# Altium footprint library 全库.PcbLib: 967 footprints (part 42 of 61)
Each footprint in its own frame and in the unit in brackets; x right, y up, seen from the top. Pads: shape width x height; smd on the part's side, far side on the other; paste and mask are expansions set on the pad; w line width, h text height; cw(c..) or ccw(c..) is an arc to the next point about the centre after c.
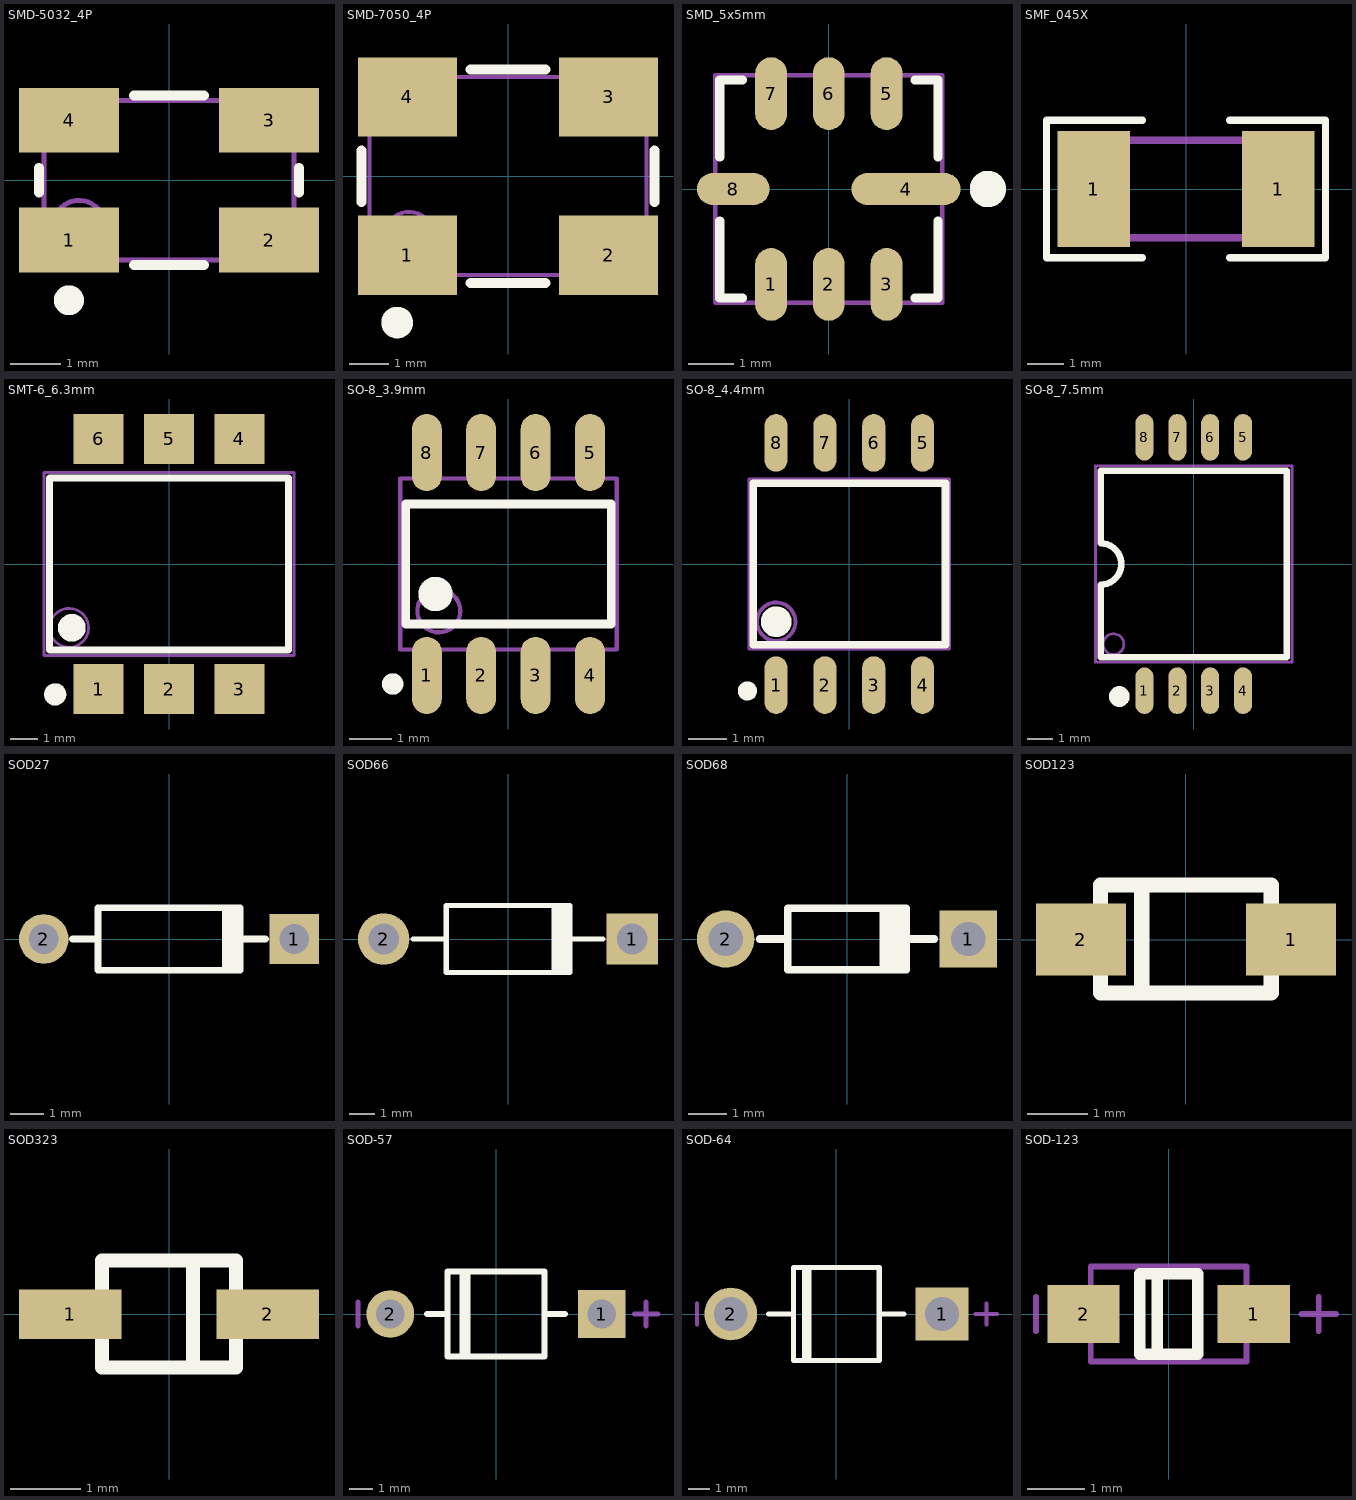
[diagram p41: the footprints below, top view; thin cyan lines are the x and y axes]

## SMD-5032_4P [mm]
pads (4):
  rect 2x1.3 smd: 1(-2,-1.2) 2(2,-1.2) 3(2,1.2) 4(-2,1.2)
Top Overlay:
  circle w0.3: c-2,-2.4 r0.15
  lines w0.2: -2.6,-0.25 -2.6,0.25 ; -0.7,-1.7 0.7,-1.7 ; -0.7,1.7 0.7,1.7 ; 2.6,-0.25 2.6,0.25
Mechanical 13:
  circle w0.1: c-1.8,-0.9 r0.5
  lines w0.1: -2.5,-1.6 -2.5,1.6 2.5,1.6 2.5,-1.6 -2.5,-1.6

## SMD-7050_4P [mm]
pads (4):
  rect 2.5x2 smd: 1(-2.54,-2) 2(2.54,-2) 3(2.54,2) 4(-2.54,2)
Top Overlay:
  circle w0.4: c-2.8,-3.7 r0.2
  lines w0.254: -3.7,-0.65 -3.7,0.65 ; -0.95,-2.7 0.95,-2.7 ; -0.95,2.7 0.95,2.7 ; 3.7,-0.65 3.7,0.65
Mechanical 13:
  circle w0.1: c-2.5,-1.5 r0.6
  lines w0.1: -3.5,-2.5 3.5,-2.5 3.5,2.5 -3.5,2.5 -3.5,-2.5

## SMD_5x5mm [mm]
pads (8):
  oval 0.7x1.6 smd mask+0.051: 1(-1.27,-2.1) 2(0,-2.1) 3(1.27,-2.1) 5(1.27,2.1) 6(0,2.1) 7(-1.27,2.1)
  oval 2.4x0.7 smd mask+0.051: 4(1.7,0)
  oval 1.6x0.7 smd mask+0.051: 8(-2.1,0)
Top Overlay:
  circle w0.4: c3.5,0 r0.2
  lines w0.2: -2.4,-0.7 -2.4,-2.4 -1.9,-2.4 ; -2.4,0.7 -2.4,2.4 -1.9,2.4 ; 1.9,-2.4 2.4,-2.4 2.4,-0.7 ; 1.9,2.4 2.4,2.4 2.4,0.7
Mechanical 13:
  lines w0.1: -2.5,-2.5 2.5,-2.5 2.5,2.5 -2.5,2.5 -2.5,-2.5

## SMF_045X [mm]
pads (2):
  rect 2x3.2 smd: 1(-2.55,0) 1(2.55,0)
Top Overlay:
  lines w0.2: -1.2,-1.9 -3.861,-1.9 -3.861,1.9 -1.2,1.9 ; 1.2,-1.9 3.861,-1.9 3.861,1.9 1.2,1.9
Mechanical 13:
  lines w0.2: -3.05,-1.35 -3.05,1.35 3.05,1.35 3.05,-1.35 -3.05,-1.35

## SMT-6_6.3mm [mm]
pads (6):
  rect 1.8x1.8 smd: 1(-2.54,-4.505) 2(0,-4.505) 3(2.54,-4.505) 4(2.54,4.505) 5(0,4.505) 6(-2.54,4.505)
Top Overlay:
  circle w0.4: c-4.1,-4.7 r0.2
  circle w0.5: c-3.5,-2.3 r0.25
  lines w0.254: -4.3,-3.1 4.3,-3.1 4.3,3.1 -4.3,3.1 -4.3,-3.1
Mechanical 13:
  circle w0.1: c-3.6,-2.3 r0.7
  lines w0.1: -4.5,-3.3 4.5,-3.3 4.5,3.3 -4.5,3.3 -4.5,-3.3

## SO-8_3.9mm [mm]
pads (8):
  oval 0.7x1.8 smd: 1(-1.905,-2.6) 2(-0.635,-2.6) 3(0.635,-2.6) 4(1.905,-2.6) 5(1.905,2.6) 6(0.635,2.6) 7(-0.635,2.6) 8(-1.905,2.6)
Top Overlay:
  circle w0.4: c-1.7,-0.7 r0.2
  circle w0.25: c-2.7,-2.8 r0.125
  lines w0.2: -2.4,-1.4 2.4,-1.4 2.4,1.4 -2.4,1.4 -2.4,-1.4
Mechanical 13:
  circle w0.1: c-1.625,-1.095 r0.5
  lines w0.1: -2.525,-1.995 2.525,-1.995 2.525,1.995 -2.525,1.995 -2.525,-1.995

## SO-8_4.4mm [mm]
pads (8):
  oval 0.6x1.5 smd: 1(-1.905,-3.15) 2(-0.635,-3.15) 3(0.635,-3.15) 4(1.905,-3.15) 5(1.905,3.15) 6(0.635,3.15) 7(-0.635,3.15) 8(-1.905,3.15)
Top Overlay:
  circle w0.4: c-1.9,-1.5 r0.2
  circle w0.25: c-2.65,-3.3 r0.125
  lines w0.2: -2.5,-2.1 2.5,-2.1 2.5,2.1 -2.5,2.1 -2.5,-2.1
Mechanical 13:
  circle w0.1: c-1.9,-1.5 r0.5
  lines w0.1: -2.6,-2.2 2.6,-2.2 2.6,2.2 -2.6,2.2 -2.6,-2.2

## SO-8_7.5mm [mm]
pads (8):
  oval 0.7x1.8 smd: 1(-1.905,-4.9) 2(-0.635,-4.9) 3(0.635,-4.9) 4(1.905,-4.9) 5(1.905,4.9) 6(0.635,4.9) 7(-0.635,4.9) 8(-1.905,4.9)
Top Overlay:
  circle w0.4: c-2.875,-5.125 r0.2
  lines w0.254: -3.6,-3.6 3.6,-3.6 3.6,3.6 -3.6,3.6 -3.6,0.8 cw(c-3.6,0) -3.6,-0.8 -3.6,-3.6
Mechanical 13:
  circle w0.1: c-3.1,-3.1 r0.4
  lines w0.1: -3.8,-3.8 3.8,-3.8 3.8,3.8 -3.8,3.8 -3.8,-3.8

## SOD27 [mm] "Diode, Axial; Body 4.3 x 1.9 mm (LxDia. max), Lead Dia. 0.56 mm (max)"
height 1.9
pads (2):
  rect 1.5x1.5 hole 0.9: 1(3.79,0)
  round 1.5 hole 0.9: 2(-3.79,0)
Top Overlay:
  rectangle: 1.6,-0.95 2.25,0.95
  lines w0.2: -2.921,0 -2.15,0 ; 2.15,-0.95 -2.15,-0.95 -2.15,0.95 2.15,0.95 ; 2.159,0 2.921,0

## SOD66 [mm] "Diode, Axial; Body 4.8 x 2.6 mm (LxDia. max), Lead Dia. 0.81 mm (max)"
height 2.6
pads (2):
  rect 2x2 hole 1.2: 1(4.83,0)
  round 2 hole 1.2: 2(-4.83,0)
Top Overlay:
  rectangle: 1.7,-1.3 2.5,1.3
  lines w0.2: -3.683,0 -2.4,0 ; 2.4,-1.3 -2.4,-1.3 -2.4,1.3 2.4,1.3 ; 2.413,0 3.683,0

## SOD68 [mm] "Diode, Axial; Body 3 x 1.6 mm (LxDia. max), Lead Dia. 0.55 mm (max)"
height 1.6
pads (2):
  rect 1.5x1.5 hole 0.9: 1(3.175,0)
  round 1.5 hole 0.9: 2(-3.175,0)
Top Overlay:
  rectangle: 0.85,-0.8 1.65,0.8
  lines w0.2: -2.286,0 -1.55,0 ; 1.55,-0.8 -1.55,-0.8 -1.55,0.8 1.55,0.8 ; 1.651,0 2.286,0

## SOD123 [mm]
pads (2):
  rect 1.5x1.2 smd: 1(1.753,0) 2(-1.752,0)
Top Overlay:
  lines w0.254: -0.736,-0.889 -0.736,0.911 ; -1.427,-0.889 1.423,-0.889 1.423,0.911 -1.427,0.911 -1.427,-0.889

## SOD323 [mm] "SOD-323/SC-76; 2 Leads; Body 1.7 x 1.3 mm, (LxW)"
height 1.1
pads (2):
  rect 1.45x0.7 smd: 1(-1.397,0) 2(1.397,0)
Top Overlay:
  lines w0.2: 0.339,-0.75 0.339,0.762 ; -0.95,-0.75 -0.95,0.762 0.95,0.762 0.95,-0.75 -0.95,-0.75

## SOD-57 [mm]
pads (2):
  rect 2x2 hole 1.2: 1(4.445,0)
  round 2 hole 1.2: 2(-4.445,0)
Top Overlay:
  lines w0.254: -2.9,0 -2.032,0 ; -1.4,-1.778 -1.4,1.778 ; -1.2,-1.778 -1.2,1.778 ; 2.032,0 2.9,0 ; -2.032,-1.778 -2.032,1.778 2.032,1.778 2.032,-1.778 -2.032,-1.778
Mechanical 15:
  lines w0.203: -5.8,-0.5 -5.8,0.5 ; 5.8,0 6.8,0 ; 6.3,-0.5 6.3,0.5

## SOD-64 [mm]
pads (2):
  rect 2.5x2.5 hole 1.6: 1(5,0)
  round 2.5 hole 1.6: 2(-5,0)
Top Overlay:
  lines w0.254: -3.2,0 -2.032,0 ; -1.5,-2.2 -1.5,2.2 ; -1.3,-2.2 -1.3,2.2 ; 2.032,0 3.2,0 ; -2.032,-2.2 -2.032,2.2 2.032,2.2 2.032,-2.2 -2.032,-2.2
Mechanical 15:
  lines w0.203: -6.6,-0.5 -6.6,0.5 ; 6.6,0 7.6,0 ; 7.1,-0.5 7.1,0.5

## SOD-123 [mm]
pads (2):
  rect 1.25x1 smd: 1(1.475,0) 2(-1.475,0)
Top Overlay:
  lines w0.2: -0.2,-0.7 -0.2,0.7 ; -0.5,-0.7 0.5,-0.7 0.5,0.7 -0.5,0.7 -0.5,-0.7
Mechanical 13:
  lines w0.1: -1.35,-0.825 -1.35,0.825 1.35,0.825 1.35,-0.825 -1.35,-0.825
Mechanical 15:
  lines w0.1: -2.3,-0.3 -2.3,0.3 ; 2.3,0 2.9,0 ; 2.6,-0.3 2.6,0.3
3D body "SOD123.STEP": height 1.35, standoff 0, extent -1.85,-0.775 1.85,0.775